# Altium footprint library 集大电协1.2.PcbLib: 175 footprints (part 11 of 11)
Each footprint in its own frame and in the unit in brackets; x right, y up, seen from the top. Pads: shape width x height; smd on the part's side, far side on the other; paste and mask are expansions set on the pad; w line width, h text height; cw(c..) or ccw(c..) is an arc to the next point about the centre after c.
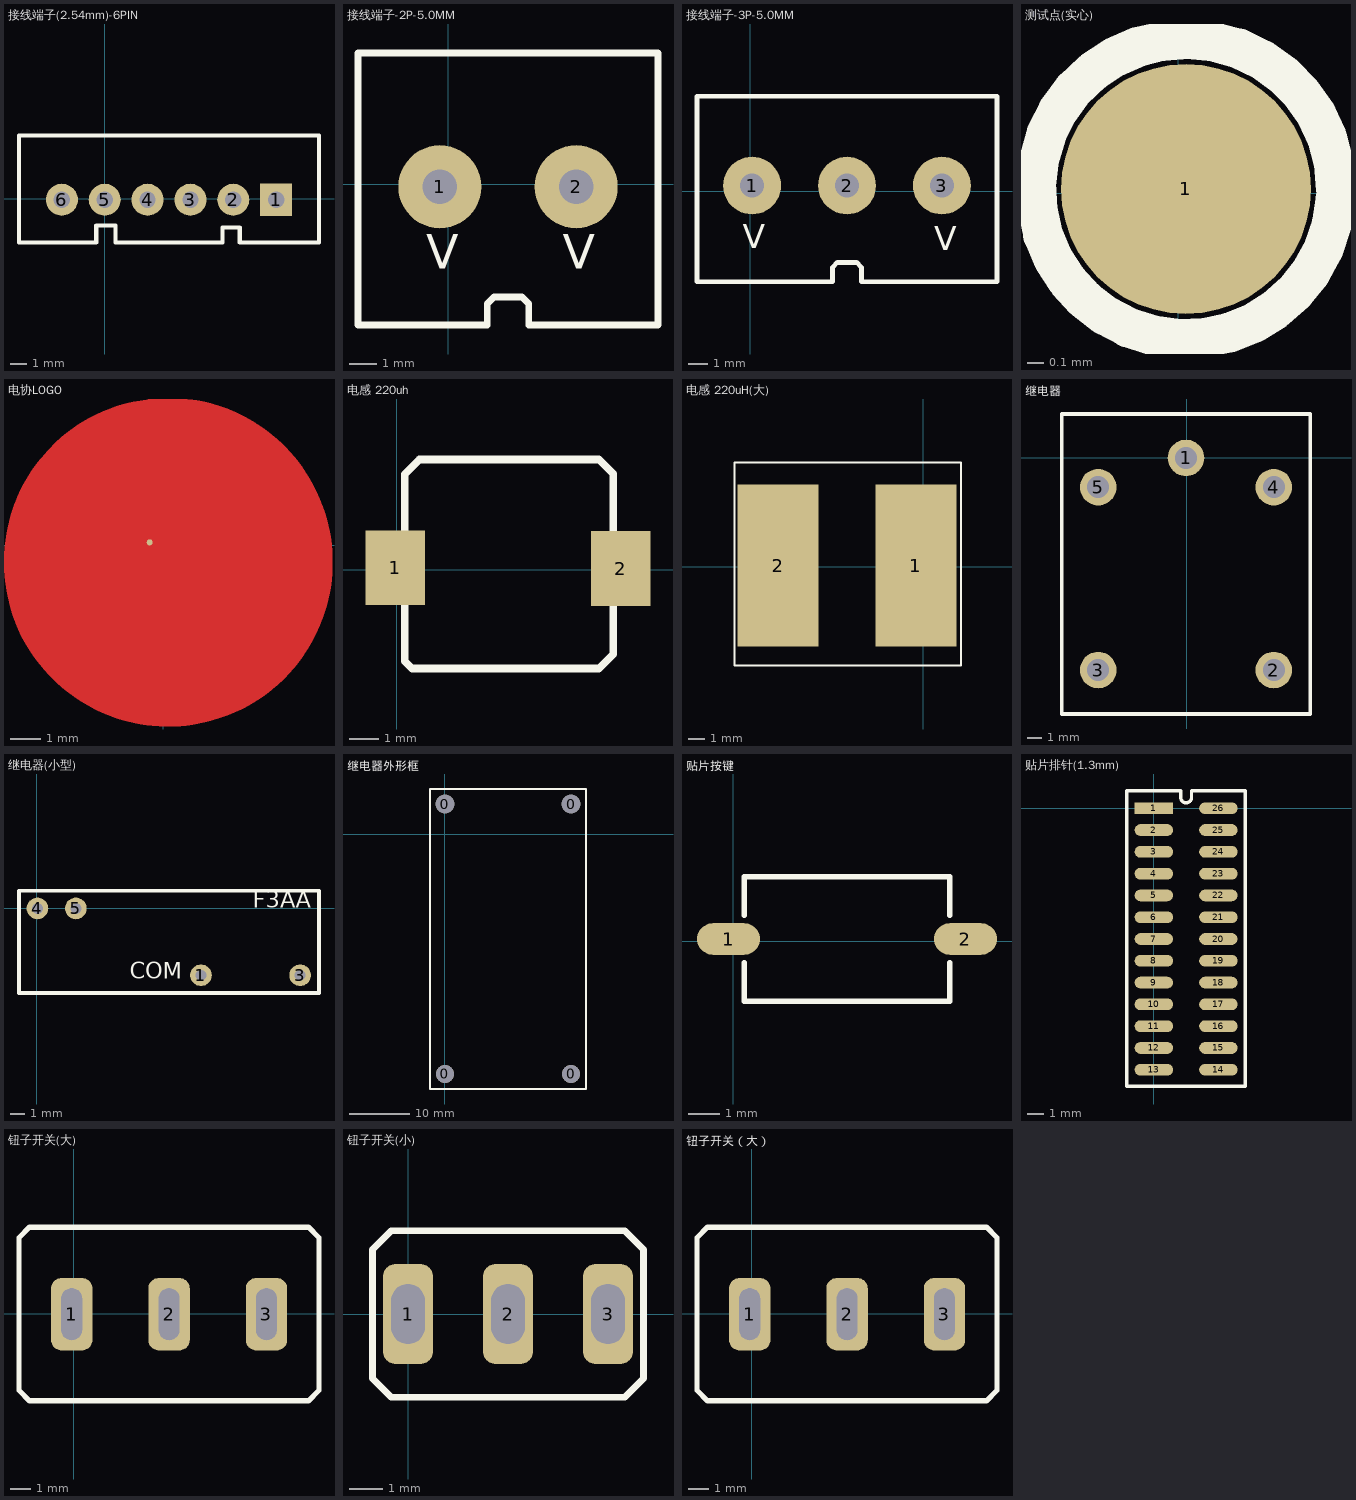
[diagram p10: the footprints below, top view; thin cyan lines are the x and y axes]

## 接线端子(2.54mm)-6PIN [mil]
pads (6):
  rect 75x75 hole 38: 1(399.35,-2.1)
  round 75 hole 38: 2(299.35,-2.1) 3(199.35,-2.1) 4(99.35,-2.1) 5(-0.65,-2.1) 6(-100.65,-2.1)
Top Overlay:
  lines w10: -200.65,-102.1 -20.65,-102.1 -20.65,-62.1 14.35,-62.1 24.35,-62.1 24.35,-102.1 274.35,-102.1 274.35,-67.1 314.35,-67.1 314.35,-102.1 499.35,-102.1 499.35,147.9 -200.65,147.9 -200.65,-102.1
3D body: height 236.22, standoff -78.74, extent -125.98,-74.8 425.2,102.36

## 接线端子-2P-5.0MM [mil]
pads (2):
  round 120 hole 50: 1(-11.81,-3.94) 2(185.04,-3.94)
Top Overlay:
  lines w10: -129.92,-203.31 56.61,-203.31 56.61,-173.31 66.61,-163.31 106.61,-163.31 116.61,-173.31 116.61,-203.31 136.61,-203.31 ; -129.92,-200.79 -129.92,188.98 303.15,188.98 303.15,-200.79 ; 126.61,-203.31 303.15,-203.31
  text "V" at 165.35,-122.05 h50
  text "V" at -31.5,-122.05 h50
3D body: height 433.07, standoff -78.74, extent -106.3,-153.54 287.4,161.42

## 接线端子-3P-5.0MM [mil]
pads (3):
  round 120 hole 50: 1(3.94,11.81) 2(200.79,11.81) 3(397.64,11.81)
Top Overlay:
  lines w10: -110.24,-187.56 -110.24,196.85 511.81,196.85 511.81,-187.56 230.79,-187.56 230.79,-157.56 220.79,-147.56 180.79,-147.56 170.79,-157.56 170.79,-187.56 -110.24,-187.56
  text "V" at 381.89,-122.05 h50
  text "V" at -15.75,-118.11 h50
3D body: height 433.07, standoff -78.74, extent -94.49,-153.54 496.06,161.42

## 测试点(实心) [mm]
pads (1):
  round 1.5 all layers, no hole: 1(0.048,0.025)
Top Overlay:
  lines w0.24: 0.946,-0.035 cw(c0.048,0.025) 0.948,0.025

## 电协LOGO [mm]
pads (1):
  round 0.2 smd: 1(-0.438,0.1)
Top Layer:
  circle w7.5: c0.172,-0.549 r1.665
  region: -0.107,0.911 -0.761,0.079 -0.717,-0.168 0.324,-0.016 -0.082,-0.626 0.07,-0.626 1.01,0.467 -0.222,0.187 0.108,0.949
  region: 0.172,4.327 -0.107,3.896 -4.476,-3.191 -4.273,-3.191 -1.25,-3.192 -1.2,-3.115 -1.368,-2.834 -1.454,-2.861 -3.765,-2.861 -3.079,-1.743 -3.13,-1.642 -3.943,-2.937 -1.403,-2.937 -1.288,-3.115 -4.324,-3.115 0.172,4.15 1.544,1.914 4.642,-3.115 2.61,-3.115 2.56,-3.191 4.795,-3.191 4.541,-2.785
  region: -0.92,1.965 -0.565,2.499 0.172,3.718 4.261,-2.937 2.712,-2.937 2.763,-2.861 4.109,-2.861 0.172,3.565 -0.819,1.965
  region: 1.442,2.219 1.848,2.219 3.601,-0.702 3.423,-1.007 3.372,-0.905 3.499,-0.702 1.798,2.143 1.493,2.143
  region: -0.971,-2.861 0.807,-2.861 2.229,-2.861 2.204,-2.937 -0.971,-2.937
  region: -0.819,-3.115 0.959,-3.115 2.128,-3.115 2.102,-3.191 -0.819,-3.191
  region: -1.479,-3.572 -0.412,-3.572 1.01,-3.572 0.985,-3.648 -1.53,-3.648 -1.809,-3.166 -1.708,-3.191
  region: 1.213,2.6 2.052,2.6 4.007,-0.753 3.626,-1.388 3.576,-1.286 3.906,-0.753 2.001,2.524 1.213,2.524
  region: -0.895,2.6 -1.757,2.6 -3.689,-0.727 -2.38,-2.909 -2.317,-2.861 -3.587,-0.727 -1.708,2.524 -0.895,2.524
  region: -2.114,1.965 -4.425,1.965 -2.825,-0.6 -2.774,-0.549 -4.273,1.889 -2.165,1.889
  region: -2.228,1.711 -3.879,1.711 -2.647,-0.27 -2.571,-0.245 -3.727,1.635 -2.317,1.635
  region: -1.098,1.66 -2.889,-1.273 -2.838,-1.349 -0.996,1.66
  region: 2.788,-0.6 1.391,-2.873 1.417,-2.912 1.518,-2.861 2.839,-0.676
  region: 2.991,-0.905 1.772,-2.886 1.874,-2.912 3.042,-0.981
  region: 3.166,-1.266 1.798,-3.572 1.417,-3.572 1.391,-3.648 1.848,-3.648 3.245,-1.311
  region: 3.398,-1.591 2.001,-3.953 1.163,-3.953 1.112,-4.029 2.052,-4.029 3.449,-1.692
  region: -2.978,-0.346 -2.993,-0.254 -3.282,-0.727 -1.973,-2.909 -1.911,-2.861 -3.181,-0.727 -2.919,-0.329
  region: -1.695,-3.953 -0.628,-3.953 0.794,-3.953 0.769,-4.029 -1.746,-4.029 -2.254,-3.14 -2.152,-3.166
  region: -0.742,-4.029 -0.133,-5.02 0.179,-5.549 1.721,-3.14 1.62,-3.14 0.179,-5.375 -0.666,-3.978 -0.742,-4.004
  region: -2.413,-0.636 -0.133,-4.385 0.179,-4.914 1.315,-3.14 1.213,-3.14 0.179,-4.74 -0.666,-3.343 -2.393,-0.524
  region: -2.616,-0.94 -0.992,-3.61 -0.908,-3.61 -0.917,-3.57 -2.597,-0.829
  region: 1.036,1.279 0.959,0.695 0.629,0.949 0.68,1 0.909,0.822 0.959,1.203 -1.047,0.949 -0.857,-0.918 0.959,-0.88 1.239,-0.499 -0.692,-0.753 -0.895,0.924 0.68,1 0.655,0.975 0.629,0.949 -0.819,0.873 -0.641,-0.676 1.264,-0.422 1.391,-0.397 0.985,-0.93 -0.92,-0.981 -1.123,1
  region: -1.581,1.965 1.188,1.965 1.188,1.94 1.213,1.889 -1.631,1.889
  region: -1.809,1.635 -1.758,1.711 1.315,1.711 1.366,1.635
  region: -0.742,2.219 1.036,2.219 1.01,2.219 1.061,2.194 1.061,2.143 -0.793,2.143
  region: -1.123,2.219 -1.53,2.219 -2.813,0.098 -2.749,0.035 -1.479,2.143 -1.174,2.143
  region: 1.95,1.965 1.594,1.965 1.544,1.914 1.645,1.914 1.671,1.889 1.95,1.889
  region: 2.128,1.711 1.772,1.711 1.721,1.66 1.798,1.635 1.823,1.635 1.848,1.635 2.128,1.635
  region: -0.463,2.6 0.807,2.6 0.832,2.575 0.858,2.549 0.883,2.524 -0.514,2.524
  region: 2.407,1.965 4.846,1.965 4.871,1.965 3.601,-0.067 3.537,-0.003 4.719,1.889 2.433,1.889
  region: 1.848,1.711 4.287,1.711 4.312,1.711 3.372,0.213 3.347,0.34 4.16,1.635 1.874,1.635
  region: 2.966,-0.295 3.118,-0.041 3.169,-0.092 3.169,-0.143 3.042,-0.346 2.991,-0.346
  region: 3.169,-0.626 3.322,-0.372 3.372,-0.422 3.372,-0.473 3.245,-0.676 3.195,-0.676
  text "协" at 0.401,-2.683 h0.76
  text "电" at -0.539,-2.683 h0.76
  text "大" at 1.315,-1.794 h0.76
  text "集" at -1.352,-1.794 h0.76
Top Solder:
  drawing of 33 lines, arcs and shapes, not listed
  text "集" at -1.352,-1.794 h0.76
  text "大" at 1.315,-1.794 h0.76
  text "电" at -0.539,-2.683 h0.76
  text "协" at 0.401,-2.683 h0.76

## 电感 220uh [mm]
pads (2):
  rect 2x2.5 smd: 1(-0.048,0.065) 2(7.496,0.04)
Top Overlay:
  lines w0.254: 0.262,-3.058 0.512,-3.308 6.762,-3.308 7.247,-2.823 7.247,3.207 6.762,3.692 0.762,3.692 0.262,3.192 0.262,-3.058
3D body: height 4, standoff 0, extent 0.203,-3.404 7.315,3.708

## 电感 220uH(大) [mm]
pads (2):
  rect 5x10 smd: 1(-0.444,0.06) 2(-8.944,0.06)
Top Overlay:
  lines w0.127: -11.62,-6.09 -11.62,6.41 2.325,6.41 2.325,-6.09 -11.62,-6.09
3D body: height 4, standoff 0, extent -8.597,-3.279 -1.485,3.833

## 继电器 [mil]
pads (5):
  round 100 hole 60: 1(-2.19,-1.05) 2(237.81,-581.05) 3(-242.19,-581.05) 4(237.81,-81.05) 5(-242.19,-81.05)
Top Overlay:
  lines w10: -342.19,58.95 -342.19,118.95 337.81,118.95 ; -342.19,78.95 -342.19,-701.05 337.81,-701.05 337.81,78.95 337.81,118.95 ; -262.19,118.95 337.81,118.95
3D body "继电器.ST": height 587.01, standoff -98.43, extent -330.71,-732.28 334.65,133.86

## 继电器(小型) [mil] "F3AA (20mm*7mm)"
pads (4):
  round 60 hole 30: 1(454.72,-186.02) 3(729.33,-186.02) 4(1.97,-0.98) 5(108.27,-0.98)
Top Overlay:
  lines w10: -49.21,-235.24 781.5,-235.24 781.5,48.23 -49.21,48.23 -49.21,-235.24
  text "COM" at 257.87,-211.61 h78.74
  text "F3AA" at 597.44,-14.76 h78.74
Mechanical 1:
3D body: height 590.55, standoff 0, extent -50.2,-232.28 780.51,49.21

## 继电器外形框 [mm]
pads (4):
  round 3 hole 3: 0(0,-40) 0(21,-40)
  round 3.1 hole 3.1: 0(0,5) 0(21,5)
Top Overlay:
  lines w0.254: -2.5,-42.5 23.5,-42.5 23.5,7.5 7.5,7.5 -2.5,7.5 -2.5,-42.5
3D body: height 20, standoff 10, extent -2.5,-42.5 23.5,7.5
3D body: height 15, standoff 0, extent -1.542,3.452 1.55,6.548
3D body: height 15, standoff 0, extent 19.458,3.452 22.55,6.548
3D body: height 15, standoff 0, extent 19.458,-41.548 22.55,-38.452
3D body: height 15, standoff 0, extent -1.542,-41.548 1.55,-38.452
3D body: height 25, standoff 15, extent 4.5,-35 17.5,-17.5

## 贴片按键 [mil]
pads (2):
  oval 80x40 smd: 1(-5.71,2.8) 2(294.29,2.8)
Top Overlay:
  lines w7: 14.13,-27.2 14.13,-75.94 274.19,-75.94 274.45,-27.21 ; 14.13,32.8 14.13,81.54 274.29,81.54 274.29,32.8
3D body: height 47.24, standoff 31.5, extent 94.29,-27.2 194.29,32.8
3D body "TVBU19.STEP": height 98.43, standoff 0, extent 24.22,-69.03 264.38,76.64

## 贴片排针(1.3mm) [mm]
pads (26):
  rect 2.3x0.7 smd: 1(0,0)
  oval 2.3x0.7 smd: 2(0,-1.3) 3(0,-2.6) 4(0,-3.9) 5(0,-5.2) 6(0,-6.5) 7(0,-7.8) 8(0,-9.1) 9(0,-10.4) 10(0,-11.7) 11(0,-13) 12(0,-14.3) 13(0,-15.6) 14(3.85,-15.6) 15(3.85,-14.3) 16(3.85,-13) 17(3.85,-11.7) 18(3.85,-10.4) 19(3.85,-9.1) 20(3.85,-7.8) 21(3.85,-6.5) 22(3.85,-5.2) 23(3.85,-3.9) 24(3.85,-2.6) 25(3.85,-1.3) 26(3.85,0)
Top Overlay:
  lines w0.2: -1.626,-16.586 5.461,-16.586 5.461,1.041 2.25,1.041 2.25,0.65 cw(c1.925,0.65) 1.6,0.65 1.6,1.041 -1.626,1.041 -1.626,-16.586

## 钮子开关(大) [mm]
pads (3):
  rrect50% 2x3.5 hole 1 slot 2.5 at 90 deg: 1(-0.102,-0.025) 2(4.598,-0.025) 3(9.298,-0.025)
Top Overlay:
  lines w0.254: 10.817,4.175 11.071,4.175 ; 11.071,4.175 11.325,4.175 11.833,3.667 11.833,-0.143 11.833,-3.699 11.325,-4.207 -2.137,-4.207 -2.645,-3.699 -2.645,3.667 -2.137,4.175 11.071,4.175
3D body: height 28.19, standoff -3.17, extent -1.85,-6.06 10.85,5.8

## 钮子开关(小) [mm]
pads (3):
  rrect50% 1.5x3 hole 1 slot 1.8 at 90 deg: 1(0,0) 2(3,0) 3(6,0)
Top Overlay:
  lines w0.2: -1.064,-1.936 -0.5,-2.5 3,-2.5 6.5,-2.5 7.064,-1.936 7.064,1.936 6.5,2.5 -0.5,2.5 -1.064,1.936 -1.064,-1.936

## 钮子开关（大） [mm]
pads (3):
  rrect50% 2x3.5 hole 1 slot 2.5 at 90 deg: 1(-0.102,-0.025) 2(4.598,-0.025) 3(9.298,-0.025)
Top Overlay:
  lines w0.254: 10.817,4.175 11.071,4.175 ; 11.071,4.175 11.325,4.175 11.833,3.667 11.833,-0.143 11.833,-3.699 11.325,-4.207 -2.137,-4.207 -2.645,-3.699 -2.645,3.667 -2.137,4.175 11.071,4.175
3D body "SW3dPS-SWITCH SPDT_O_N_O.STEP": height 28.19, standoff -3.17, extent -1.85,-6.06 10.85,5.8